# Altium footprint library X98_CARRIER_V1R2_12082022.PcbLib: 104 footprints (part 4 of 7)
Each footprint in its own frame and in the unit in brackets; x right, y up, seen from the top. Pads: shape width x height; smd on the part's side, far side on the other; paste and mask are expansions set on the pad; w line width, h text height; cw(c..) or ccw(c..) is an arc to the next point about the centre after c.
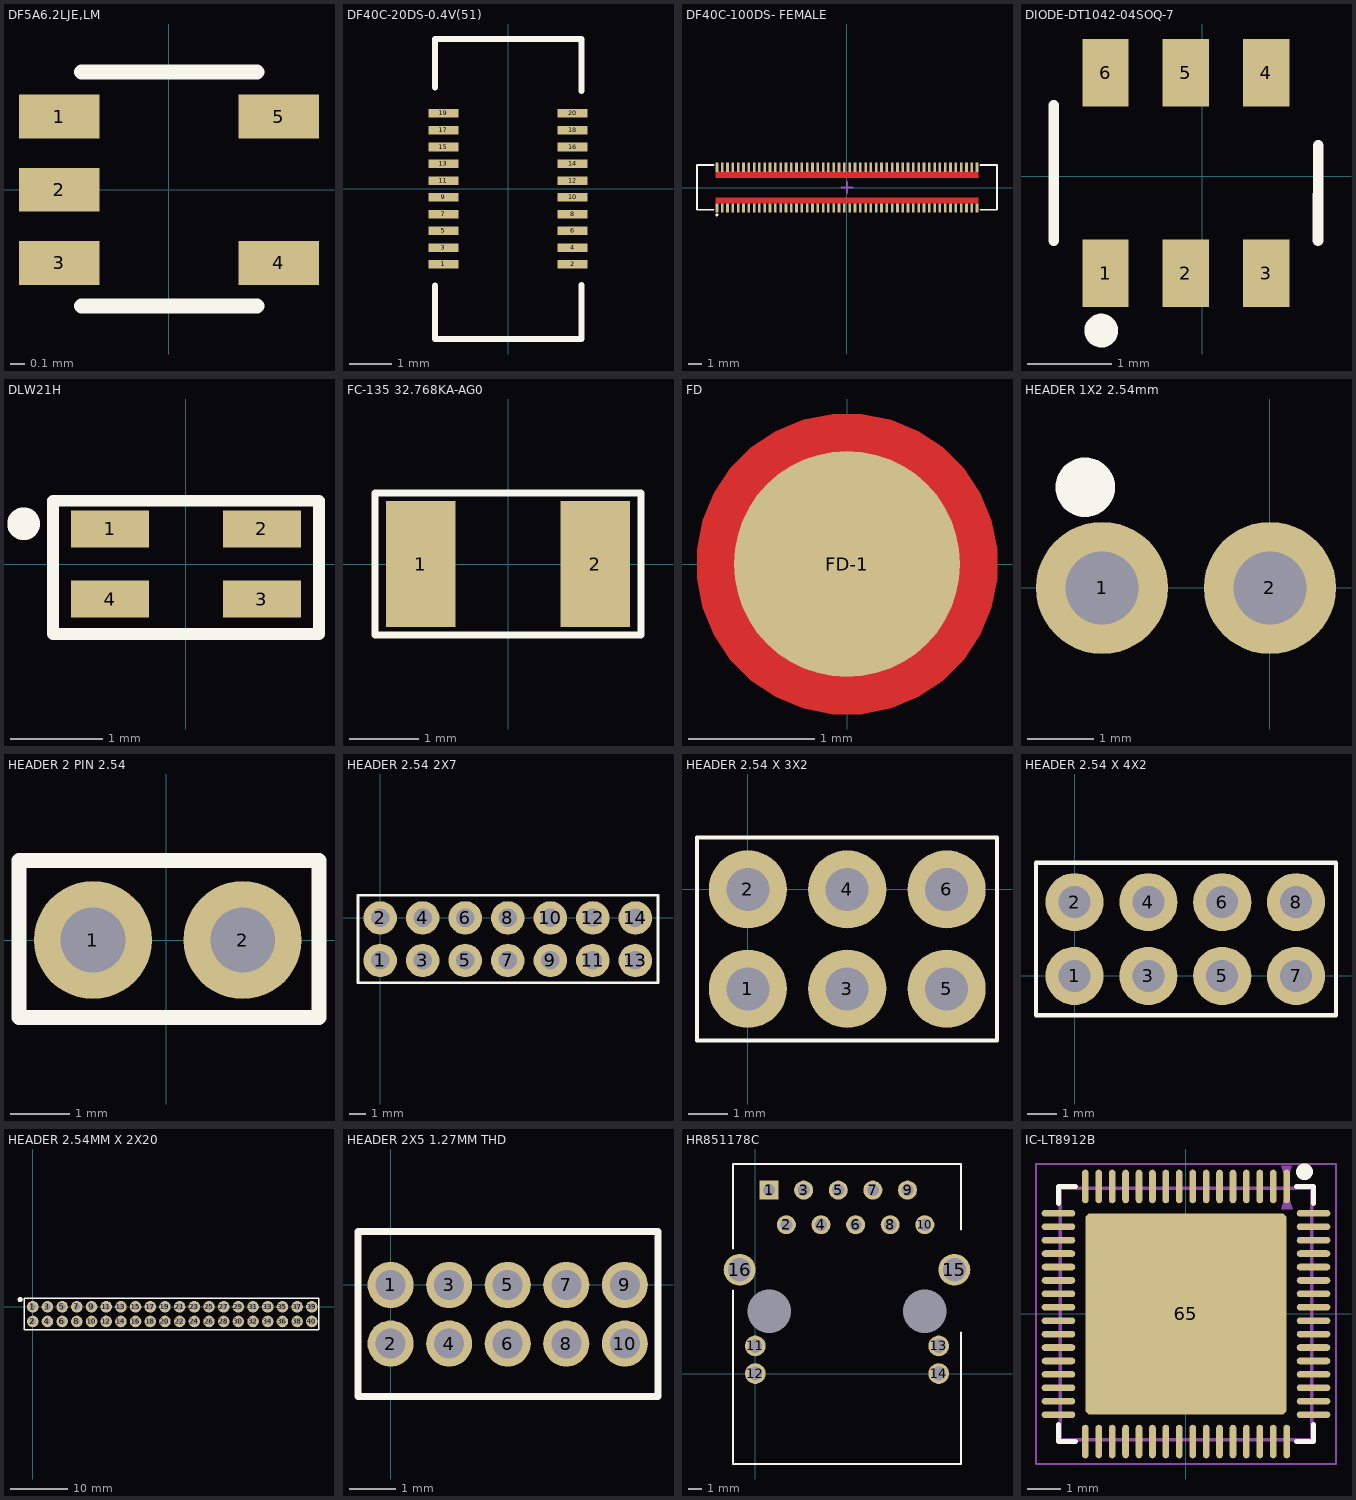
[diagram p3: the footprints below, top view; thin cyan lines are the x and y axes]

## DF5A6.2LJE,LM [mm]
pads (5):
  rect 0.55x0.3 smd mask+0.051: 1(-0.75,0.5) 2(-0.75,0) 3(-0.75,-0.5) 4(0.75,-0.5) 5(0.75,0.5)
Top Overlay:
  lines w0.102: -0.598,-0.795 0.602,-0.795 ; -0.598,0.805 0.602,0.805
3D body "User Library-sot-553.STEP": height 0.45, standoff -0.05, extent -0.8,-0.787 0.8,0.813

## DF40C-20DS-0.4V(51) [mil]
pads (20):
  rect 28x8 smd mask+2: 1(-60.63,-70.87) 2(60.63,-70.87) 3(-60.63,-55.12) 4(60.63,-55.12) 5(-60.63,-39.37) 6(60.63,-39.37) 7(-60.63,-23.62) 8(60.63,-23.62) 9(-60.63,-7.87) 10(60.63,-7.87) 11(-60.63,7.87) 12(60.63,7.87) 13(-60.63,23.62) 14(60.63,23.62) 15(-60.63,39.37) 16(60.63,39.37) 17(-60.63,55.12) 18(60.63,55.12) 19(-60.63,70.87) 20(60.63,70.87)
Top Overlay:
  lines w6: -68.58,-90.76 -68.58,-140.93 69.04,-140.93 69.04,-90.25 ; -68.58,95.29 -68.58,140.79 69.04,140.79 69.04,92.23
  text "." at -87.24,-72.67 h30
3D body "DF40C-20DS.stp": height 55.51, standoff -1.57, extent -69.29,-129.91 63.78,129.93

## DF40C-100DS- FEMALE [mm]
pads (100):
  rect 0.2x0.7 smd mask+0.025: 1(-9.8,-1.54) 2(-9.8,1.54) 3(-9.4,-1.54) 4(-9.4,1.54) 5(-9,-1.54) 6(-9,1.54) 7(-8.6,-1.54) 8(-8.6,1.54) 9(-8.2,-1.54) 10(-8.2,1.54) 11(-7.8,-1.54) 12(-7.8,1.54) 13(-7.4,-1.54) 14(-7.4,1.54) 15(-7,-1.54) 16(-7,1.54) 17(-6.6,-1.54) 18(-6.6,1.54) 19(-6.2,-1.54) 20(-6.2,1.54) 21(-5.8,-1.54) 22(-5.8,1.54) 23(-5.4,-1.54) 24(-5.4,1.54) 25(-5,-1.54) 26(-5,1.54) 27(-4.6,-1.54) 28(-4.6,1.54) 29(-4.2,-1.54) 30(-4.2,1.54) 31(-3.8,-1.54) 32(-3.8,1.54) 33(-3.4,-1.54) 34(-3.4,1.54) 35(-3,-1.54) 36(-3,1.54) 37(-2.6,-1.54) 38(-2.6,1.54) 39(-2.2,-1.54) 40(-2.2,1.54) 41(-1.8,-1.54) 42(-1.8,1.54) 43(-1.4,-1.54) 44(-1.4,1.54) 45(-1,-1.54) 46(-1,1.54) 47(-0.6,-1.54) 48(-0.6,1.54) 49(-0.2,-1.54) 50(-0.2,1.54) 51(0.2,-1.54) 52(0.2,1.54) 53(0.6,-1.54) 54(0.6,1.54) 55(1,-1.54) 56(1,1.54) 57(1.4,-1.54) 58(1.4,1.54) 59(1.8,-1.54) 60(1.8,1.54) 61(2.2,-1.54) 62(2.2,1.54) 63(2.6,-1.54) 64(2.6,1.54) 65(3,-1.54) 66(3,1.54) 67(3.4,-1.54) 68(3.4,1.54) 69(3.8,-1.54) 70(3.8,1.54) 71(4.2,-1.54) 72(4.2,1.54) 73(4.6,-1.54) 74(4.6,1.54) 75(5,-1.54) 76(5,1.54) 77(5.4,-1.54) 78(5.4,1.54) 79(5.8,-1.54) 80(5.8,1.54) 81(6.2,-1.54) 82(6.2,1.54) 83(6.6,-1.54) 84(6.6,1.54) 85(7,-1.54) 86(7,1.54) 87(7.4,-1.54) 88(7.4,1.54) 89(7.8,-1.54) 90(7.8,1.54) 91(8.2,-1.54) 92(8.2,1.54) 93(8.6,-1.54) 94(8.6,1.54) 95(9,-1.54) 96(9,1.54) 97(9.4,-1.54) 98(9.4,1.54) 99(9.8,-1.54) 100(9.8,1.54)
Top Layer:
  pour cut-out: -9.906,1.194 -9.906,1.193 -9.906,0.75 9.906,0.75 9.906,1.194
  pour cut-out: 9.906,-1.194 9.906,-1.193 9.906,-0.75 -9.906,-0.75 -9.906,-1.194
Top Overlay:
  circle w0.127: c-9.804,-2.057 r0.051
  lines w0.127: -10.033,-1.676 -11.303,-1.676 -11.303,1.702 -10.033,1.702 ; 10.033,-1.676 11.303,-1.676 11.303,1.702 10.033,1.702
Mechanical 15:
  lines w0.127: -0.432,0 0,0 ; 0,-0.432 0,0 ; 0,0.432 0,0 ; 0.432,0 0,0
3D body "DF40C-100DS.stp": height 1.44, standoff -0.01, extent -11.3,-1.676 11.3,1.704

## DIODE-DT1042-04SOQ-7 [mm]
pads (6):
  rrect0% 0.55x0.8 smd mask+0.05: 1(-1.143,-1.143) 2(-0.193,-1.143) 3(0.757,-1.143) 4(0.757,1.227) 5(-0.193,1.227) 6(-1.143,1.227)
Top Overlay:
  circle w0.2: c-1.193,-1.823 r0.1
  lines w0.127: -1.757,-0.758 -1.757,0.842 ; 1.371,-0.758 1.376,0.367
3D body "SOT26_DIO.step": height 1.3, standoff 0, extent -1.74,-1.106 1.36,1.394

## DLW21H [mm]
pads (4):
  rect 0.85x0.4 smd: 1(-0.826,0.381) 2(0.826,0.381) 3(0.826,-0.381) 4(-0.826,-0.381)
Top Overlay:
  circle w0.254: c-1.767,0.438 r0.051
  lines w0.127: -1.448,-0.762 1.448,-0.762 1.448,0.69 -1.448,0.69 -1.448,-0.762
3D body: height 1, standoff 0, extent -1.269,-0.761 1.269,0.761

## FC-135 32.768KA-AG0 [mm] "CRYSTAL 32.7680KHZ 7PF SMD"
pads (2):
  rect 1x1.8 smd mask+0.05: 1(-1.25,0) 2(1.25,0)
Top Overlay:
  lines w0.102: -1.905,-1.016 -1.905,1.016 1.905,1.016 1.905,-1.016 -1.905,-1.016

## FD [mm] "Fiducial Diameter 20 mil"
height 1.1
pads (1):
  round 1.8 smd paste-1.8 mask+0: FD-1(0,0)
Top Layer:
  pour cut-out: 0,1.194 -0.118,1.194 -0.348,1.148 -0.565,1.058 -0.761,0.927 -0.927,0.761 -1.058,0.565 -1.148,0.348 -1.194,0.118 -1.194,0 -1.194,-0.118 -1.148,-0.348 -1.058,-0.565 -0.927,-0.761 -0.761,-0.927 -0.565,-1.058 -0.348,-1.148 -0.118,-1.194 0,-1.194 0.118,-1.194 0.348,-1.148 0.565,-1.058 0.761,-0.927 0.927,-0.761 1.058,-0.565 1.148,-0.348 1.194,-0.118 1.194,0 1.194,0.118 1.148,0.348 1.058,0.565 0.927,0.761 0.761,0.927 0.565,1.058 0.348,1.148 0.118,1.194

## HEADER 1X2 2.54mm [mm]
pads (2):
  round 2 hole 1.1: 1(-2.54,0) 2(0,0)
Top Overlay:
  circle w0.5: c-2.794,1.524 r0.2
3D body "User Library-Header1x2.STEP": height 2.04, standoff -8.94, extent -3.785,-1.27 1.295,1.27

## HEADER 2 PIN 2.54 [mm]
pads (2):
  round 2 hole 1.1: 1(-1.245,0) 2(1.295,0)
Top Overlay:
  lines w0.254: -2.5,1.353 -2.5,-1.314 2.591,-1.314 2.591,1.353 -2.496,1.353
3D body "User Library-Header1x2.STEP": height 2.04, standoff -8.94, extent -2.489,-1.27 2.591,1.27

## HEADER 2.54 2X7 [mm]
pads (14):
  round 2 hole 1.1: 1(0,-2.54) 2(0,0) 3(2.54,-2.54) 4(2.54,0) 5(5.08,-2.54) 6(5.08,0) 7(7.62,-2.54) 8(7.62,0) 9(10.16,-2.54) 10(10.16,0) 11(12.7,-2.54) 12(12.7,0) 13(15.24,-2.54) 14(15.24,0)
Top Overlay:
  lines w0.152: -1.325,-3.868 16.594,-3.868 16.594,1.348 -1.325,1.348 -1.325,-3.868
3D body "User Library-Header1x2.STEP": height 2.04, standoff -8.94, extent -1.245,-1.27 3.835,1.27
3D body "User Library-Header1x2.STEP": height 2.04, standoff -8.94, extent 3.835,-1.27 8.915,1.27
3D body "User Library-Header1x2.STEP": height 2.04, standoff -8.94, extent 3.835,-3.81 8.915,-1.27
3D body "User Library-Header1x2.STEP": height 2.04, standoff -8.94, extent -1.245,-3.81 3.835,-1.27
3D body "User Library-Header1x2.STEP": height 2.04, standoff -8.94, extent 8.915,-3.81 13.995,-1.27
3D body "User Library-Header1x2.STEP": height 2.04, standoff -8.94, extent 8.915,-1.27 13.995,1.27
3D body "User Library-Header1x2.STEP": height 2.04, standoff -8.94, extent 13.97,-3.785 16.51,1.295

## HEADER 2.54 X 3X2 [mm]
pads (6):
  round 2 hole 1.1: 1(0,-2.54) 2(0,0) 3(2.54,-2.54) 4(2.54,0) 5(5.08,-2.54) 6(5.08,0)
Top Overlay:
  lines w0.102: -1.3,-3.862 -1.3,1.328 6.369,1.328 6.369,-3.862 -1.3,-3.862
3D body "User Library-Header1x2.STEP": height 2.04, standoff -8.94, extent 3.77,-3.81 6.31,1.27
3D body "User Library-Header1x2.STEP": height 2.04, standoff -8.94, extent -1.245,-1.27 3.835,1.27
3D body "User Library-Header1x2.STEP": height 2.04, standoff -8.94, extent -1.245,-3.81 3.835,-1.27

## HEADER 2.54 X 4X2 [mm]
pads (8):
  round 2 hole 1.1: 1(0,0) 2(0,2.54) 3(2.54,0) 4(2.54,2.54) 5(5.08,0) 6(5.08,2.54) 7(7.62,0) 8(7.62,2.54)
Top Overlay:
  lines w0.152: -1.325,-1.348 8.993,-1.348 8.993,3.888 -1.325,3.888 -1.325,-1.348
3D body "User Library-Header1x2.STEP": height 2.04, standoff -8.94, extent -1.245,1.27 3.835,3.81
3D body "User Library-Header1x2.STEP": height 2.04, standoff -8.94, extent 3.835,1.27 8.915,3.81
3D body "User Library-Header1x2.STEP": height 2.04, standoff -8.94, extent 3.835,-1.27 8.915,1.27
3D body "User Library-Header1x2.STEP": height 2.04, standoff -8.94, extent -1.245,-1.27 3.835,1.27

## HEADER 2.54MM X 2X20 [mm]
pads (40):
  round 2 hole 1.1: 1(0,0) 2(0,-2.54) 3(2.54,0) 4(2.54,-2.54) 5(5.08,0) 6(5.08,-2.54) 7(7.62,0) 8(7.62,-2.54) 9(10.16,0) 10(10.16,-2.54) 11(12.7,0) 12(12.7,-2.54) 13(15.24,0) 14(15.24,-2.54) 15(17.78,0) 16(17.78,-2.54) 17(20.32,0) 18(20.32,-2.54) 19(22.86,0) 20(22.86,-2.54) 21(25.4,0) 22(25.4,-2.54) 23(27.94,0) 24(27.94,-2.54) 25(30.48,0) 26(30.48,-2.54) 27(33.02,0) 28(33.02,-2.54) 29(35.56,0) 30(35.56,-2.54) 31(38.1,0) 32(38.1,-2.54) 33(40.64,0) 34(40.64,-2.54) 35(43.18,0) 36(43.18,-2.54) 37(45.72,0) 38(45.72,-2.54) 39(48.26,0) 40(48.26,-2.54)
Top Overlay:
  circle w0.5: c-2.183,1.244 r0.2
  lines w0.254: -1.495,-3.997 49.505,-3.997 49.505,1.503 -1.495,1.503 -1.495,-2.997 -1.495,-3.997 ; -1.495,-3.997 -1.495,-3.997
3D body "User Library-Header1x2.STEP": height 2.04, standoff -8.94, extent 44.447,-3.82 49.527,-1.28
3D body "User Library-Header1x2.STEP": height 2.04, standoff -8.94, extent 44.447,-1.28 49.527,1.26
3D body "User Library-Header1x2.STEP": height 2.04, standoff -8.94, extent 39.367,-3.82 44.447,-1.28
3D body "User Library-Header1x2.STEP": height 2.04, standoff -8.94, extent 39.367,-1.28 44.447,1.26
3D body "User Library-Header1x2.STEP": height 2.04, standoff -8.94, extent 34.287,-3.82 39.367,-1.28
3D body "User Library-Header1x2.STEP": height 2.04, standoff -8.94, extent 34.287,-1.28 39.367,1.26
3D body "User Library-Header1x2.STEP": height 2.04, standoff -8.94, extent 29.207,-3.82 34.287,-1.28
3D body "User Library-Header1x2.STEP": height 2.04, standoff -8.94, extent 29.207,-1.28 34.287,1.26
3D body "User Library-Header1x2.STEP": height 2.04, standoff -8.94, extent 24.127,-3.82 29.207,-1.28
3D body "User Library-Header1x2.STEP": height 2.04, standoff -8.94, extent 24.127,-1.28 29.207,1.26
3D body "User Library-Header1x2.STEP": height 2.04, standoff -8.94, extent 19.047,-3.82 24.127,-1.28
3D body "User Library-Header1x2.STEP": height 2.04, standoff -8.94, extent 19.047,-1.28 24.127,1.26
3D body "User Library-Header1x2.STEP": height 2.04, standoff -8.94, extent 13.967,-3.82 19.047,-1.28
3D body "User Library-Header1x2.STEP": height 2.04, standoff -8.94, extent 13.967,-1.28 19.047,1.26
3D body "User Library-Header1x2.STEP": height 2.04, standoff -8.94, extent 8.887,-3.82 13.967,-1.28
3D body "User Library-Header1x2.STEP": height 2.04, standoff -8.94, extent 8.887,-1.28 13.967,1.26
3D body "User Library-Header1x2.STEP": height 2.04, standoff -8.94, extent 3.807,-3.82 8.887,-1.28
3D body "User Library-Header1x2.STEP": height 2.04, standoff -8.94, extent 3.807,-1.28 8.887,1.26
3D body "User Library-Header1x2.STEP": height 2.04, standoff -8.94, extent -1.273,-3.82 3.807,-1.28
3D body "User Library-Header1x2.STEP": height 2.04, standoff -8.94, extent -1.273,-1.28 3.807,1.26

## HEADER 2X5 1.27MM THD [mm]
pads (10):
  round 1 hole 0.65: 1(0,0) 2(0,-1.27) 3(1.27,0) 4(1.27,-1.27) 5(2.54,0) 6(2.54,-1.27) 7(3.81,0) 8(3.81,-1.27) 9(5.08,0) 10(5.08,-1.27)
Top Overlay:
  lines w0.152: -0.707,-2.42 -0.707,1.161 5.799,1.161 5.799,-2.42 -0.707,-2.42
3D body "HPH2-A-10-UA.STEP": height 4, standoff -2.3, extent -0.634,-2.349 5.716,1.101

## HR851178C [mil]
pads (18):
  rect 55x55 / inner round 55 / far side rect 55x55 hole 35: 1(39.57,529.92)
  round 55 hole 35: 2(89.57,429.92) 3(139.57,529.92) 4(189.57,429.92) 5(239.57,529.92) 6(289.57,429.92) 7(339.57,529.92) 8(389.57,429.92) 9(439.57,529.92) 10(489.57,429.92)
  round 60 hole 40: 11(0,79.92) 12(0,0) 13(529.53,79.92) 14(529.53,0)
  round 92 hole 67 mask+3: 15(574.81,300)
  round 92 hole 67: 16(-45.27,300)
  round 10 hole 126 unplated: ""(39.77,179.92) ""(489.77,179.92)
Top Overlay:
  lines w6: -64.08,240.17 -64.08,-261.14 593.62,-261.14 593.62,117.85 ; -64.08,361.4 -64.08,605.23 593.62,605.23 593.62,415.85
3D body: height 533.46, standoff 0, extent -86.36,-245.08 625.73,607.29

## IC-LT8912B [mm]
pads (65):
  oval 0.2x1 smd mask+0: 1(3,3.8) 2(2.6,3.8) 3(2.2,3.8) 4(1.8,3.8) 5(1.4,3.8) 6(1,3.8) 7(0.6,3.8) 8(0.2,3.8) 9(-0.2,3.8) 10(-0.6,3.8) 11(-1,3.8) 12(-1.4,3.8) 13(-1.8,3.8) 14(-2.2,3.8) 15(-2.6,3.8) 16(-3,3.8) 33(-3,-3.8) 34(-2.6,-3.8) 35(-2.2,-3.8) 36(-1.8,-3.8) 37(-1.4,-3.8) 38(-1,-3.8) 39(-0.6,-3.8) 40(-0.2,-3.8) 41(0.2,-3.8) 42(0.6,-3.8) 43(1,-3.8) 44(1.4,-3.8) 45(1.8,-3.8) 46(2.2,-3.8) 47(2.6,-3.8) 48(3,-3.8)
  oval 1x0.2 smd mask+0: 17(-3.8,3) 18(-3.8,2.6) 19(-3.8,2.2) 20(-3.8,1.8) 21(-3.8,1.4) 22(-3.8,1) 23(-3.8,0.6) 24(-3.8,0.2) 25(-3.8,-0.2) 26(-3.8,-0.6) 27(-3.8,-1) 28(-3.8,-1.4) 29(-3.8,-1.8) 30(-3.8,-2.2) 31(-3.8,-2.6) 32(-3.8,-3) 49(3.8,-3) 50(3.8,-2.6) 51(3.8,-2.2) 52(3.8,-1.8) 53(3.8,-1.4) 54(3.8,-1) 55(3.8,-0.6) 56(3.8,-0.2) 57(3.8,0.2) 58(3.8,0.6) 59(3.8,1) 60(3.8,1.4) 61(3.8,1.8) 62(3.8,2.2) 63(3.8,2.6) 64(3.8,3)
  rrect5% 6x6 smd paste-6 mask+0: 65(0,0)
Top Overlay:
  circle w0.25: c3.531,4.24 r0.125
  lines w0.15: -3.8,-3.3 -3.8,-3.8 -3.3,-3.8 ; -3.8,3.3 -3.8,3.8 -3.3,3.8 ; 3.3,-3.8 3.8,-3.8 3.8,-3.3 ; 3.3,3.8 3.8,3.8 3.8,3.3
Top Paste:
  region: 2.5,-0.3 0.3,-0.3 0.3,-2.5 2.5,-2.5
  region: -0.3,-2.5 -0.3,-0.3 -2.5,-0.3 -2.5,-2.5
  rectangle: -2.5,0.3 -0.3,2.5
  region: 0.3,2.5 0.3,0.3 2.5,0.3 2.5,2.5
Top 3D Body:
  lines w0.001: -3.751,-3.751 -3.751,3.751 3.751,3.751 3.751,-3.751 -3.751,-3.751
Top Component Center:
  circle w0.05: c0,0 r0.35
  lines w0.05: -0.5,0 0.5,0 ; 0,-0.5 0,0.5
Top Component Outline:
  region: 2.841,4.425 3,3.895 3.159,4.425
  lines w0.05: -4.47,-4.47 4.47,-4.47 4.47,4.47 -4.47,4.47 -4.47,-4.47
Top Dimensions:
  region: 3.177,3.12 3.009,3.68 2.841,3.12
  lines w0.1: -3.75,-3.75 3.75,-3.75 3.75,3.75 -3.75,3.75 -3.75,-3.75
Top Assembly:
  text ".Designator" at -0.4,-0.248 h0.76
3D body "test-677.step": height 0.8, standoff 0, extent -3.751,-3.751 3.751,3.751